# Altium footprint library AD_Connectors.PcbLib: 131 footprints (part 7 of 9)
Each footprint in its own frame and in the unit in brackets; x right, y up, seen from the top. Pads: shape width x height; smd on the part's side, far side on the other; paste and mask are expansions set on the pad; w line width, h text height; cw(c..) or ccw(c..) is an arc to the next point about the centre after c.
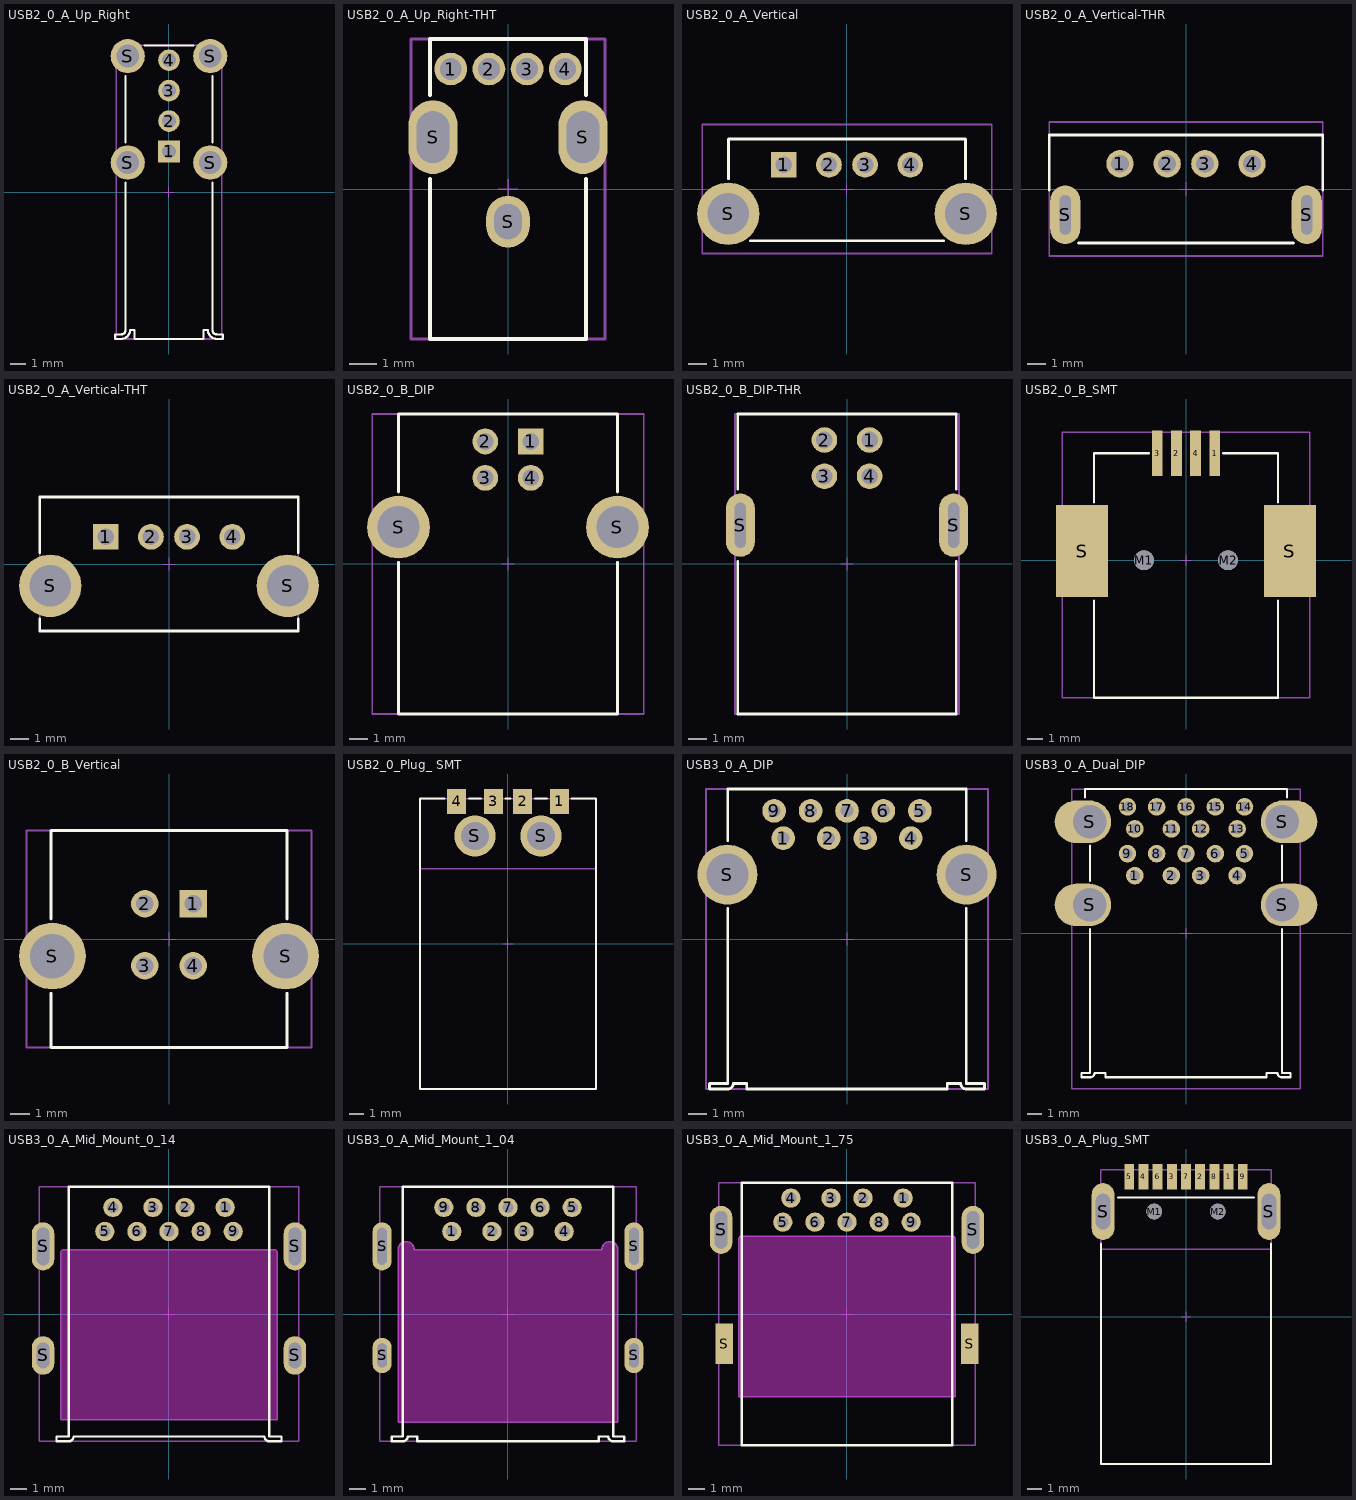
[diagram p6: the footprints below, top view; thin cyan lines are the x and y axes]

## USB2_0_A_Up_Right [mm] "USB 2.0 Type A Up Right"
height 14.5
pads (8):
  rect 1.42x1.42 hole 0.92: 1(0,2.68)
  round 1.42 hole 0.92: 2(0,4.68) 3(0,6.68) 4(0,8.68)
  round 2.25 hole 1.5: S(-2.71,1.95) S(-2.71,8.95) S(2.71,1.95) S(2.71,8.95)
Top Overlay:
  lines w0.15: -2.86,0.63 -2.86,-9.06 cw(c-3.15,-9.06) -3.15,-9.35 -3.55,-9.35 -3.55,-9.65 -3.15,-9.65 ccw(c-3.15,-9.06) -2.56,-9.06 -2.27,-9.06 -2.27,-9.65 2.27,-9.65 2.27,-9.06 2.56,-9.06 ccw(c3.15,-9.06) 3.15,-9.65 3.55,-9.65 3.55,-9.35 3.15,-9.35 cw(c3.15,-9.06) 2.86,-9.06 2.86,0.63 ; -2.86,3.27 -2.86,7.64 ; -1.59,9.65 1.59,9.65 ; 2.86,3.27 2.86,7.64
Mechanical 13:
  lines w0.1: -3.475,-9.65 -3.475,9.65 3.475,9.65 3.475,-9.65 -3.475,-9.65
Mechanical 15:
  lines w0.05: -0.35,0 0.35,0 ; 0,-0.35 0,0.35
3D body "614004134726.stp": height 14.51, standoff -3.8, extent -3.55,-9.65 3.55,9.65

## USB2_0_A_Up_Right-THT [mm] "USB 2.0 Type A Up Right THT"
height 14.2
pads (7):
  round 1.2 hole 0.8: 1(-2.1,4.4) 2(-0.7,4.4) 3(0.7,4.4) 4(2.1,4.4)
  oval 1.8x2.7 hole 1.2 slot 1.9 at 90 deg: S(-2.75,1.9) S(2.75,1.9)
  oval 1.6x1.9 hole 1 slot 1.3 at 90 deg: S(0,-1.2)
Top Overlay:
  lines w0.15: -2.86,0.36 -2.86,-5.5 2.86,-5.5 2.86,0.36 ; -2.86,3.44 -2.86,5.5 2.86,5.5 2.86,3.44
Mechanical 1:
  text "PCB Thickness 1.2mm" at -3.5,-6.3 h0.76
Mechanical 13:
  lines w0.1: -3.56,-5.5 -3.56,5.5 3.56,5.5 3.56,-5.5 -3.56,-5.5
Mechanical 15:
  lines w0.05: -0.35,0 0.35,0 ; 0,-0.35 0,0.35
3D body "614004184726.stp": height 14.3, standoff -2.74, extent -3.56,-5.5 3.56,5.5

## USB2_0_A_Vertical [mm] "USB 2.0 Type A Vertical"
height 15
pads (6):
  rect 1.42x1.42 hole 0.92: 1(-3.5,1.34)
  round 1.42 hole 0.92: 2(-1,1.34) 3(1,1.34) 4(3.5,1.34)
  round 3.45 hole 2.3: S(-6.57,-1.37) S(6.57,-1.37)
Top Overlay:
  lines w0.15: -6.55,0.56 -6.55,2.76 6.55,2.76 6.55,0.56 ; -5.35,-2.86 5.34,-2.86
Mechanical 1:
  text "PCB Thickness 1.6mm" at -3.4,-4.1 h0.76
Mechanical 13:
  lines w0.1: -8,-3.56 8,-3.56 8,3.56 -8,3.56 -8,-3.56
Mechanical 15:
  lines w0.05: -0.35,0 0.35,0 ; 0,-0.35 0,0.35
3D body "614004135023.stp": height 15.02, standoff -4.28, extent -7.999,-3.56 7.999,3.56

## USB2_0_A_Vertical-THR [mm] "USB Type A Vertical THR"
height 14.9
pads (6):
  round 1.45 hole 0.95: 1(-3.5,1.34) 2(-1,1.34) 3(1,1.34) 4(3.5,1.34)
  oval 1.6x3.1 hole 0.6 slot 2.1 at 90 deg: S(-6.4,-1.37) S(6.4,-1.37)
Top Overlay:
  lines w0.15: -7.25,-0.05 -7.25,2.86 7.25,2.86 7.25,-0.05 ; -5.7,-2.86 5.7,-2.86
Mechanical 13:
  lines w0.1: -7.25,-3.56 7.25,-3.56 7.25,3.56 -7.25,3.56 -7.25,-3.56
Mechanical 15:
  lines w0.05: -0.35,0 0.35,0 ; 0,-0.35 0,0.35
3D body "614104135023R.stp": height 14.99, standoff -2.1, extent -7.25,-3.56 7.25,3.56

## USB2_0_A_Vertical-THT [mm] "USB 2.0 Type A Vertical Short Type THT"
height 10
pads (6):
  rect 1.42x1.42 hole 0.92: 1(-3.5,1.5)
  round 1.42 hole 0.92: 2(-1,1.5) 3(1,1.5) 4(3.5,1.5)
  round 3.45 hole 2.3: S(-6.57,-1.21) S(6.57,-1.21)
Top Overlay:
  lines w0.15: -7.15,-3.04 -7.15,-3.7 7.15,-3.7 7.15,-3.04 ; -7.15,0.62 -7.15,3.7 7.15,3.7 7.15,0.62
Mechanical 13:
  lines w0.1: -7.15,-3.7 -7.15,3.7 7.15,3.7 7.15,-3.7 -7.15,-3.7
Mechanical 15:
  lines w0.05: -0.35,0 0.35,0 ; 0,-0.35 0,0.35
3D body "614004185023.stp": height 10.05, standoff -2.95, extent -7.15,-3.7 7.15,3.7

## USB2_0_B_DIP [mm] "USB 2.0 Type B Horizontal"
height 11.05
pads (6):
  rect 1.42x1.42 hole 0.92: 1(1.25,6.74)
  round 1.42 hole 0.92: 2(-1.25,6.74) 3(-1.25,4.74) 4(1.25,4.74)
  round 3.45 hole 2.3: S(-6.02,2.03) S(6.02,2.03)
Top Overlay:
  lines w0.15: -6.02,0.1 -6.02,-8.25 6.02,-8.25 6.02,0.1 ; -6.02,3.96 -6.02,8.25 6.02,8.25 6.02,3.96
Mechanical 13:
  lines w0.1: -7.47,-8.25 -7.47,8.25 7.47,8.25 7.47,-8.25 -7.47,-8.25
Mechanical 15:
  lines w0.05: -0.35,0 0.35,0 ; 0,-0.35 0,0.35
3D body "61400416121.stp": height 11.1, standoff -3.76, extent -7.484,-8.25 7.484,8.25

## USB2_0_B_DIP-THR [mm] "USB Type B Horizontal THR"
height 11
pads (6):
  round 1.42 hole 0.92: 1(1.25,6.86) 2(-1.25,6.86) 3(-1.25,4.86) 4(1.25,4.86)
  oval 1.6x3.5 hole 0.6 slot 2.5 at 90 deg: S(-5.9,2.15) S(5.9,2.15)
Top Overlay:
  lines w0.15: -6.05,0.15 -6.05,-8.3 6.05,-8.3 6.05,0.15 ; -6.05,4.15 -6.05,8.3 6.05,8.3 6.05,4.15
Mechanical 13:
  lines w0.1: -6.2,-8.3 -6.2,8.3 6.2,8.3 6.2,-8.3 -6.2,-8.3
Mechanical 15:
  lines w0.05: -0.35,0 0.35,0 ; 0,-0.35 0,0.35
3D body "61410416121R.stp": height 11.1, standoff -2.1, extent -6.2,-8.3 6.2,8.3

## USB2_0_B_SMT [mm] "USB 2.0 Type B SMT Horizontal"
height 11.5
pads (8):
  rect 0.7x3 smd: 1(1.875,7) 2(-0.625,7) 3(-1.875,7) 4(0.625,7)
  round 1.3 hole 1.3 unplated: M1(-2.75,0) M2(2.75,0)
  rect 3.4x6.04 smd: S(-6.8,0.6) S(6.8,0.6)
Top Overlay:
  lines w0.15: -6.02,-2.64 -6.02,-9 6.02,-9 6.02,-2.64 ; -6.02,3.8 -6.02,7 -2.43,7 ; 2.43,7 6.02,7 6.02,3.8
Mechanical 13:
  lines w0.1: -8.1,-9 8.1,-9 8.1,8.388 -8.1,8.388 -8.1,-9
Mechanical 15:
  lines w0.05: -0.35,0 0.35,0 ; 0,-0.35 0,0.35
3D body "62910416121.stp": height 11.16, standoff -0.81, extent -8.1,-9 8.1,8.388

## USB2_0_B_Vertical [mm] "USB 2.0 Type B Vertical"
height 16.1
pads (6):
  rect 1.42x1.42 hole 0.92: 1(1.25,1.82)
  round 1.42 hole 0.92: 2(-1.25,1.82) 3(-1.25,-1.38) 4(1.25,-1.38)
  round 3.45 hole 2.3: S(-6.02,-0.88) S(6.02,-0.88)
Top Overlay:
  lines w0.15: -6.1,-2.8 -6.1,-5.6 6.1,-5.6 6.1,-2.8 ; -6.1,1.04 -6.1,5.6 6.1,5.6 6.1,1.04
Mechanical 13:
  lines w0.1: -7.35,-5.6 -7.35,5.6 7.35,5.6 7.35,-5.6 -7.35,-5.6
Mechanical 15:
  lines w0.05: -0.35,0 0.35,0 ; 0,-0.35 0,0.35
3D body "61400413321.stp": height 16.15, standoff -4.17, extent -7.35,-5.6 7.35,5.6

## USB2_0_Plug_ SMT [mm] "USB 2.0 Plug Type A SMT with Clip"
height 19.8
pads (6):
  rect 1.3x1.7 smd: 1(3.5,9.7) 2(1,9.7) 3(-1,9.7) 4(-3.5,9.7)
  round 2.8 hole 1.9: S(-2.25,7.35) S(2.25,7.35)
Top Overlay:
  lines w0.15: -4.35,9.9 -6,9.9 -6,-9.9 6,-9.9 6,9.9 4.35,9.9 ; -2.65,9.9 -1.85,9.9 ; -0.15,9.9 0.15,9.9 ; 1.85,9.9 2.65,9.9
Mechanical 1:
  lines w0.1: -6,5.1 6,5.1
  text "PCB Edge" at -2,4.05 h1
Mechanical 13:
  lines w0.1: -6,-9.9 6,-9.9 6,9.9 -6,9.9 -6,-9.9
Mechanical 15:
  lines w0.05: -0.35,0 0.35,0 ; 0,-0.35 0,0.35
3D body "629004113921.stp": height 2.25, standoff -2.25, extent -6,-9.9 6,9.9

## USB3_0_A_DIP [mm] "USB 3.0 Type A Horizontal"
height 6.99
pads (11):
  round 1.3 hole 0.7: 1(-3.5,5.54) 2(-1,5.54) 3(1,5.54) 4(3.5,5.54) 5(4,7.04) 6(2,7.04) 7(0,7.04) 8(-2,7.04) 9(-4,7.04)
  round 3.3 hole 2.3: S(-6.57,3.54) S(6.57,3.54)
Top Overlay:
  lines w0.15: -6.55,1.69 -6.55,-7.94 -7.55,-7.94 -7.55,-8.24 -6.56,-8.24 ccw(c-6.55,-7.94) -6.25,-7.94 -5.5,-7.94 -5.5,-8.24 5.5,-8.24 5.5,-7.94 6.25,-7.94 ccw(c6.55,-7.94) 6.56,-8.24 7.55,-8.24 7.55,-7.94 6.55,-7.94 6.55,1.69 ; -6.55,5.39 -6.55,8.24 6.55,8.24 6.55,5.39
Mechanical 13:
  lines w0.1: -7.74,-8.24 -7.74,8.24 7.74,8.24 7.74,-8.24 -7.74,-8.24
Mechanical 15:
  lines w0.05: -0.35,0 0.35,0 ; 0,-0.35 0,0.35
3D body "692121030100.stp": height 8.02, standoff -3.2, extent -7.74,-8.24 7.74,8.31

## USB3_0_A_Dual_DIP [mm] "USB 3.0 Type A Stacked"
height 15.42
pads (22):
  round 1.2 hole 0.7: 1(-3.5,3.93) 2(-1,3.93) 3(1,3.93) 4(3.5,3.93) 5(4,5.43) 6(2,5.43) 7(0,5.43) 8(-2,5.43) 9(-4,5.43) 10(-3.5,7.13) 11(-1,7.13) 12(1,7.13) 13(3.5,7.13) 14(4,8.63) 15(2,8.63) 16(0,8.63) 17(-2,8.63) 18(-4,8.63)
  oval 3.85x2.9 hole 2.3 copper offset -0.475,0: S(-6.57,1.93) S(-6.57,7.61)
  oval 3.85x2.9 hole 2.3 copper offset 0.475,0: S(6.57,1.93) S(6.57,7.61)
Top Overlay:
  lines w0.15: -6.9,9.26 -6.9,9.85 6.9,9.85 6.9,9.26 ; -6.55,0.28 -6.55,-9.55 -7.15,-9.55 -7.15,-9.85 -6.56,-9.85 ccw(c-6.55,-9.55) -6.25,-9.55 -5.5,-9.55 -5.5,-9.85 5.5,-9.85 5.5,-9.55 6.25,-9.55 ccw(c6.55,-9.55) 6.56,-9.85 7.15,-9.85 7.15,-9.55 6.55,-9.55 6.55,0.28 ; -6.55,3.58 -6.55,5.97 ; 6.55,3.58 6.55,5.97
Mechanical 13:
  lines w0.1: -7.795,-10.65 7.795,-10.65 7.795,9.85 -7.795,9.85 -7.795,-10.65
Mechanical 15:
  lines w0.05: -0.35,0 0.35,0 ; 0,-0.35 0,0.35
3D body "692141030100.stp": height 16.11, standoff -3.5, extent -7.794,-10.65 7.794,9.85

## USB3_0_A_Mid_Mount_0_14 [mm] "USB 3.0 Type A Reverse Horizontal with Offset 0.14mm"
height 5.12
pads (13):
  round 1.2 hole 0.7: 1(3.5,6.645) 2(1,6.645) 3(-1,6.645) 4(-3.5,6.645) 5(-4,5.145) 6(-2,5.145) 7(0,5.145) 8(2,5.145) 9(4,5.145)
  oval 1.4x2.4 hole 0.8 slot 1.6 at 90 deg: S(-7.85,-2.585) S(7.85,-2.585)
  oval 1.4x3 hole 0.8 slot 2.35 at 90 deg: S(-7.85,4.215) S(7.85,4.215)
Top Overlay:
  lines w0.15: -7.01,-7.935 -6.26,-7.935 ccw(c-6.25,-7.635) -5.95,-7.635 5.95,-7.635 ccw(c6.25,-7.635) 6.26,-7.935 7.01,-7.935 7.01,-7.635 6.25,-7.635 6.25,7.935 -6.25,7.935 -6.25,-7.635 -7.01,-7.635 -7.01,-7.935
Keep-Out Layer:
  board cut-out: -6.75,-6.585 6.75,-6.585 6.75,3.815 6.75,3.855 6.72,3.928 6.663,3.985 6.59,4.015 6.55,4.015 -6.55,4.015 -6.59,4.015 -6.663,3.985 -6.72,3.928 -6.75,3.855 -6.75,3.815
Mechanical 1:
  lines w0.1: -6.75,-6.585 6.75,-6.585 6.75,3.815 ccw(c6.55,3.815) 6.55,4.015 -6.55,4.015 ccw(c-6.55,3.815) -6.75,3.815 -6.75,-6.585
  text "PCB Cutout Area" at -5,-1.57 h1.5
Mechanical 13:
  lines w0.1: -8.078,-7.935 8.078,-7.935 8.078,7.935 -8.078,7.935 -8.078,-7.935
Mechanical 15:
  lines w0.05: -0.35,0 0.35,0 ; 0,-0.35 0,0.35
3D body "692121130100.stp": height 4.05, standoff -3.67, extent -8.078,-7.935 8.078,7.935

## USB3_0_A_Mid_Mount_1_04 [mm] "USB 3.0 Type A Horizontal with Offset 1.04mm"
height 3.9
pads (13):
  round 1.2 hole 0.7: 1(-3.5,5.145) 2(-1,5.145) 3(1,5.145) 4(3.5,5.145) 5(4,6.645) 6(2,6.645) 7(0,6.645) 8(-2,6.645) 9(-4,6.645)
  oval 1.2x2.2 hole 0.6 slot 1.5 at 90 deg: S(-7.85,-2.585) S(7.85,-2.585)
  oval 1.2x3 hole 0.6 slot 2.3 at 90 deg: S(-7.85,4.215) S(7.85,4.215)
Top Overlay:
  lines w0.15: -7.25,-7.935 -6.56,-7.935 ccw(c-6.55,-7.635) -6.25,-7.635 -5.65,-7.635 -5.65,-7.935 5.65,-7.935 5.65,-7.635 6.25,-7.635 ccw(c6.55,-7.635) 6.56,-7.935 7.25,-7.935 7.25,-7.635 6.55,-7.635 6.55,7.935 -6.55,7.935 -6.55,-7.635 -7.25,-7.635 -7.25,-7.935
Keep-Out Layer:
  board cut-out: -6.85,-6.755 6.85,-6.755 6.85,4.015 6.85,4.115 6.774,4.298 6.633,4.439 6.449,4.515 6.251,4.515 6.067,4.439 5.926,4.298 5.85,4.115 5.85,4.015 -5.85,4.015 -5.85,4.115 -5.926,4.298 -6.067,4.439 -6.251,4.515 -6.449,4.515 -6.633,4.439 -6.774,4.298 -6.85,4.115 -6.85,4.015
Mechanical 1:
  lines w0.1: -6.85,-6.755 6.85,-6.755 6.85,4.015 ccw(c6.35,4.015) 5.85,4.015 -5.85,4.015 ccw(c-6.35,4.015) -6.85,4.015 -6.85,-6.755
  text "PCB Cutout Area" at -4.7,-1.425 h1.5
Mechanical 13:
  lines w0.1: -8,-7.935 -8,7.935 8,7.935 8,-7.935 -8,-7.935
Mechanical 15:
  lines w0.05: -0.35,0 0.35,0 ; 0,-0.35 0,0.35
3D body "692121230100.stp": height 4.6, standoff -2.52, extent -8,-7.935 8,7.935

## USB3_0_A_Mid_Mount_1_75 [mm] "USB 3.0 Type A Reverse Horizontal with Offset 1.75mm"
height 7.4
pads (13):
  round 1.2 hole 0.7: 1(3.5,7.225) 2(1,7.225) 3(-1,7.225) 4(-3.5,7.225) 5(-4,5.725) 6(-2,5.725) 7(0,5.725) 8(2,5.725) 9(4,5.725)
  oval 1.4x3 hole 0.8 slot 2.35 at 90 deg: S(-7.85,5.245) S(7.85,5.245)
  rect 1.1x2.5 smd: S(-7.65,-1.855) S(7.65,-1.855)
Top Overlay:
  lines w0.15: -6.55,-8.185 6.55,-8.185 6.55,8.185 -6.55,8.185 -6.55,-8.185
Keep-Out Layer:
  board cut-out: -6.75,-5.155 -6.75,4.675 -6.75,4.709 -6.724,4.771 -6.676,4.819 -6.614,4.845 -6.58,4.845 6.58,4.845 6.614,4.845 6.676,4.819 6.724,4.771 6.75,4.709 6.75,4.675 6.75,-5.155
Mechanical 1:
  lines w0.1: -6.75,-5.155 -6.75,4.675 cw(c-6.58,4.675) -6.58,4.845 6.58,4.845 cw(c6.58,4.675) 6.75,4.675 6.75,-5.155 -6.75,-5.155
  text "PCB Cutout Area" at -4.75,-0.15 h1.5
Mechanical 13:
  lines w0.1: -8,-8.185 8,-8.185 8,8.185 -8,8.185 -8,-8.185
Mechanical 15:
  lines w0.05: -0.35,0 0.35,0 ; 0,-0.35 0,0.35
3D body "692121330100.stp": height 2.99, standoff -4.41, extent -8,-8.185 8,8.185

## USB3_0_A_Plug_SMT [mm] "USB 3.0 Type A SMT Plug with Clip"
height 4.5
pads (13):
  rect 0.7x1.8 smd: 1(3,9.875) 2(1,9.875) 3(-1,9.875) 4(-3,9.875) 5(-4,9.875) 6(-2,9.875) 7(0,9.875) 8(2,9.875) 9(4,9.875)
  round 1.1 hole 1.1 unplated: M1(-2.25,7.425) M2(2.25,7.425)
  oval 1.6x4 hole 1 slot 2.5 at 90 deg: S(-5.85,7.425) S(5.85,7.425)
Top Overlay:
  lines w0.15: -6,5.15 -6,-10.375 6,-10.375 6,5.15 ; -4.8,8.425 4.8,8.425
Mechanical 1:
  lines w0.1: -6,4.775 6,4.775
  text "PCB Edge" at -2,3.725 h1
Mechanical 13:
  lines w0.1: -6,-10.375 6,-10.375 6,10.375 -6,10.375 -6,-10.375
Mechanical 15:
  lines w0.05: -0.35,0 0.35,0 ; 0,-0.35 0,0.35
3D body "692112030100.stp": height 1.85, standoff -2.65, extent -6,-10.375 6,10.375